# Altium footprint library PCBLibrary.PcbLib: 90 footprints (part 1 of 6)
Each footprint in its own frame and in the unit in brackets; x right, y up, seen from the top. Pads: shape width x height; smd on the part's side, far side on the other; paste and mask are expansions set on the pad; w line width, h text height; cw(c..) or ccw(c..) is an arc to the next point about the centre after c.
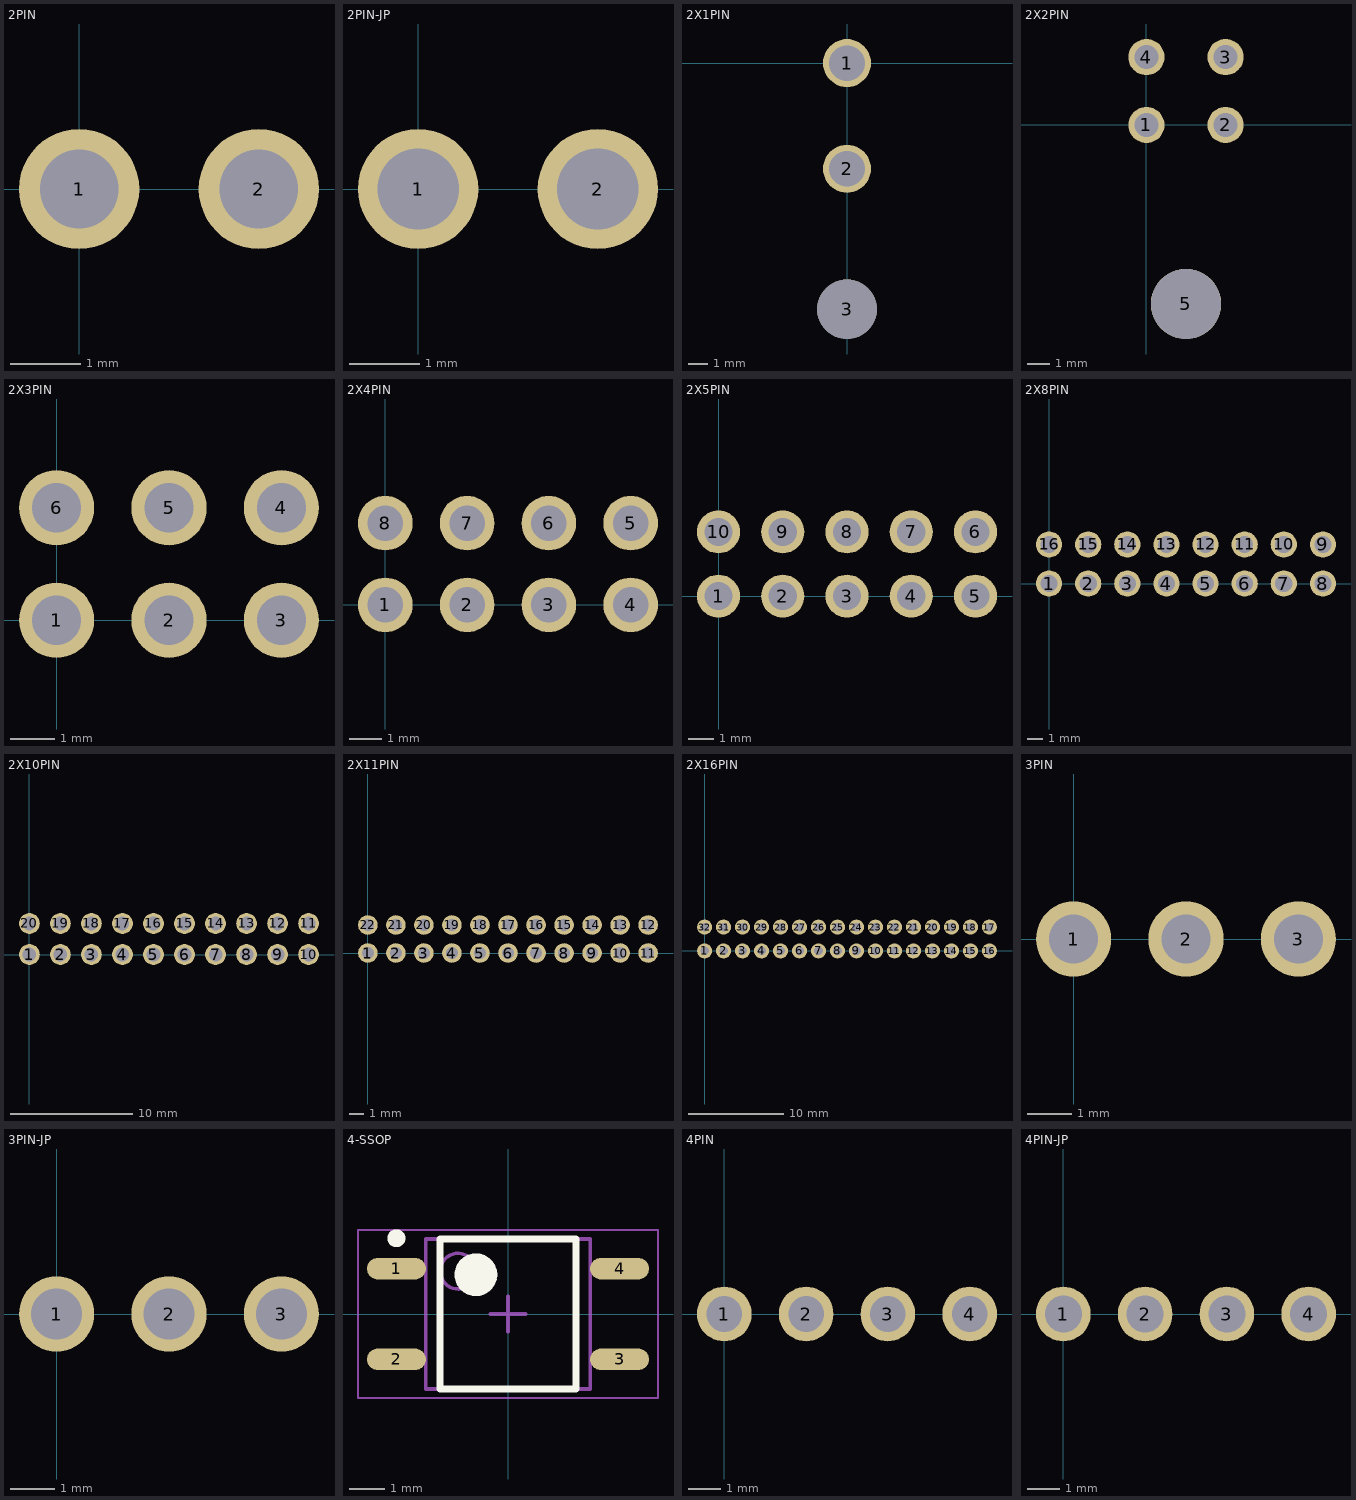
[diagram p0: the footprints below, top view; thin cyan lines are the x and y axes]

## 2PIN [mm]
pads (2):
  round 1.7 hole 1.11: 1(0,0) 2(2.54,0)
3D body "2PIN.stp": height 7.06, standoff -3.22, extent -2.483,-12.889 4.883,0.7

## 2PIN-JP [mm]
pads (2):
  round 1.7 hole 1.15: 1(0,0) 2(2.54,0)
3D body "61300211121_Download_STP_61300211121_rev1.stp": height 8.57, standoff -2.97, extent -1.24,-1.27 3.84,1.27

## 2X1PIN [mm]
pads (3):
  round 2.5 hole 1.85: 1(0,0) 2(0,-5.5)
  round 3.1 hole 3.1: 3(0,-12.8)
3D body "768250002.stp": height 14.55, standoff -3.58, extent -4.154,-21.402 4.196,0.56

## 2X2PIN [mm]
pads (5):
  round 1.6 hole 1.06: 1(0,0) 2(3.5,0) 3(3.5,3) 4(0,3)
  round 3.1 hole 3.1: 5(1.75,-7.91)
3D body "1723161104.stp": height 13.78, standoff -2.98, extent -2.75,-15.375 6.25,3.303

## 2X3PIN [mm]
pads (6):
  round 1.7 hole 1.11: 1(0,0) 2(2.54,0) 3(5.08,0) 4(5.08,2.54) 5(2.54,2.54) 6(0,2.54)
3D body "2X3PIN.stp": height 9.87, standoff -2.78, extent -2.44,-10.55 7.52,2.853

## 2X4PIN [mm]
pads (8):
  round 1.7 hole 1.11: 1(0,0) 2(2.54,0) 3(5.08,0) 4(7.62,0) 5(7.62,2.54) 6(5.08,2.54) 7(2.54,2.54) 8(0,2.54)
3D body "2X4PIN.stp": height 9.87, standoff -2.78, extent -2.45,-10.55 10.05,2.853

## 2X5PIN [mm]
pads (10):
  round 1.7 hole 1.11: 1(0,0) 2(2.54,0) 3(5.08,0) 4(7.62,0) 5(10.16,0) 6(10.16,2.54) 7(7.62,2.54) 8(5.08,2.54) 9(2.54,2.54) 10(0,2.54)
3D body "2X5PIN.stp": height 9.87, standoff -2.78, extent -2.42,-10.55 12.62,2.853

## 2X8PIN [mm]
pads (16):
  round 1.7 hole 1.11: 1(0,0) 2(2.54,0) 3(5.08,0) 4(7.62,0) 5(10.16,0) 6(12.7,0) 7(15.24,0) 8(17.78,0) 9(17.78,2.54) 10(15.24,2.54) 11(12.7,2.54) 12(10.16,2.54) 13(7.62,2.54) 14(5.08,2.54) 15(2.54,2.54) 16(0,2.54)
3D body "2X8PIN.stp": height 9.87, standoff -2.78, extent -2.36,-10.501 20.3,2.901

## 2X10PIN [mm]
pads (20):
  round 1.7 hole 1.11: 1(0,0) 2(2.54,0) 3(5.08,0) 4(7.62,0) 5(10.16,0) 6(12.7,0) 7(15.24,0) 8(17.78,0) 9(20.32,0) 10(22.86,0) 11(22.86,2.54) 12(20.32,2.54) 13(17.78,2.54) 14(15.24,2.54) 15(12.7,2.54) 16(10.16,2.54) 17(7.62,2.54) 18(5.08,2.54) 19(2.54,2.54) 20(0,2.54)
3D body "2X10PIN.stp": height 9.87, standoff -2.78, extent -2.44,-10.601 25.3,2.801

## 2X11PIN [mm]
pads (22):
  round 1.4 hole 0.85: 1(0,0) 2(2,0) 3(4,0) 4(6,0) 5(8,0) 6(10,0) 7(12,0) 8(14,0) 9(16,0) 10(18,0) 11(20,0) 12(20,2) 13(18,2) 14(16,2) 15(14,2) 16(12,2) 17(10,2) 18(8,2) 19(6,2) 20(4,2) 21(2,2) 22(0,2)
3D body "DF11-22DP-2DS.stp": height 5.66, standoff -2.34, extent -1.997,-0.275 22.003,9.725

## 2X16PIN [mm]
pads (32):
  round 1.6 hole 0.9: 1(0,0) 2(2,0) 3(4,0) 4(6,0) 5(8,0) 6(10,0) 7(12,0) 8(14,0) 9(16,0) 10(18,0) 11(20,0) 12(22,0) 13(24,0) 14(26,0) 15(28,0) 16(30,0) 17(30,2.5) 18(28,2.5) 19(26,2.5) 20(24,2.5) 21(22,2.5) 22(20,2.5) 23(18,2.5) 24(16,2.5) 25(14,2.5) 26(12,2.5) 27(10,2.5) 28(8,2.5) 29(6,2.5) 30(4,2.5) 31(2,2.5) 32(0,2.5)
3D body "2X16PIN.stp": height 11.75, standoff -3.15, extent -2.7,-9.7 32.7,4.8

## 3PIN [mm]
pads (3):
  round 1.7 hole 1.11: 1(0,0) 2(2.54,0) 3(5.08,0)
3D body "3PIN.stp": height 7.06, standoff -3.22, extent -2.54,-12.889 7.62,0.7

## 3PIN-JP [mm]
pads (3):
  round 1.7 hole 1.15: 1(0,0) 2(2.54,0) 3(5.08,0)
3D body "61300311121_Download_STP_61300311121_rev1.stp": height 8.57, standoff -2.97, extent -1.31,-1.27 6.31,1.27

## 4-SSOP [mm] "SOP, 4-Leads, Body 3.70x4.40mm, Pitch 2.54mm, IPC Medium Density"
height 2.2
pads (4):
  oval 1.65x0.6 smd: 1(-3.125,1.27) 2(-3.125,-1.27) 3(3.125,-1.27) 4(3.125,1.27)
Top Overlay:
  circle w0.25: c-3.125,2.12 r0.125
  circle w0.6: c-0.9,1.1 r0.3
  lines w0.2: -1.9,-2.1 -1.9,2.1 1.9,2.1 1.9,-2.1 -1.9,-2.1
Mechanical 13:
  circle w0.1: c-1.4,1.2 r0.5
  lines w0.1: -2.3,-2.1 -2.3,2.1 2.3,2.1 2.3,-2.1 -2.3,-2.1
Mechanical 15:
  lines w0.05: -4.2,-2.35 -4.2,2.35 4.2,2.35 4.2,-2.35 -4.2,-2.35
  lines w0.1: -0.5,0 0.5,0 ; 0,-0.5 0,0.5
3D body "SOP254P680X220-4N.step": height 2.2, standoff 0, extent -3.375,-2.1 3.375,2.1

## 4PIN [mm]
pads (4):
  round 1.7 hole 1.11: 1(0,0) 2(2.54,0) 3(5.08,0) 4(7.62,0)
3D body "4PIN.stp": height 7.06, standoff -3.22, extent -2.55,-12.823 10.15,0.766

## 4PIN-JP [mm]
pads (4):
  round 1.7 hole 1.15: 1(0,0) 2(2.54,0) 3(5.08,0) 4(7.62,0)
3D body "61300411121_Downlaod_STP_61300411121_rev1.stp": height 8.57, standoff -2.97, extent -1.28,-1.27 8.88,1.27